# Altium footprint library Shield_v31.PcbLib: 24 footprints (part 2 of 2)
Each footprint in its own frame and in the unit in brackets; x right, y up, seen from the top. Pads: shape width x height; smd on the part's side, far side on the other; paste and mask are expansions set on the pad; w line width, h text height; cw(c..) or ccw(c..) is an arc to the next point about the centre after c.
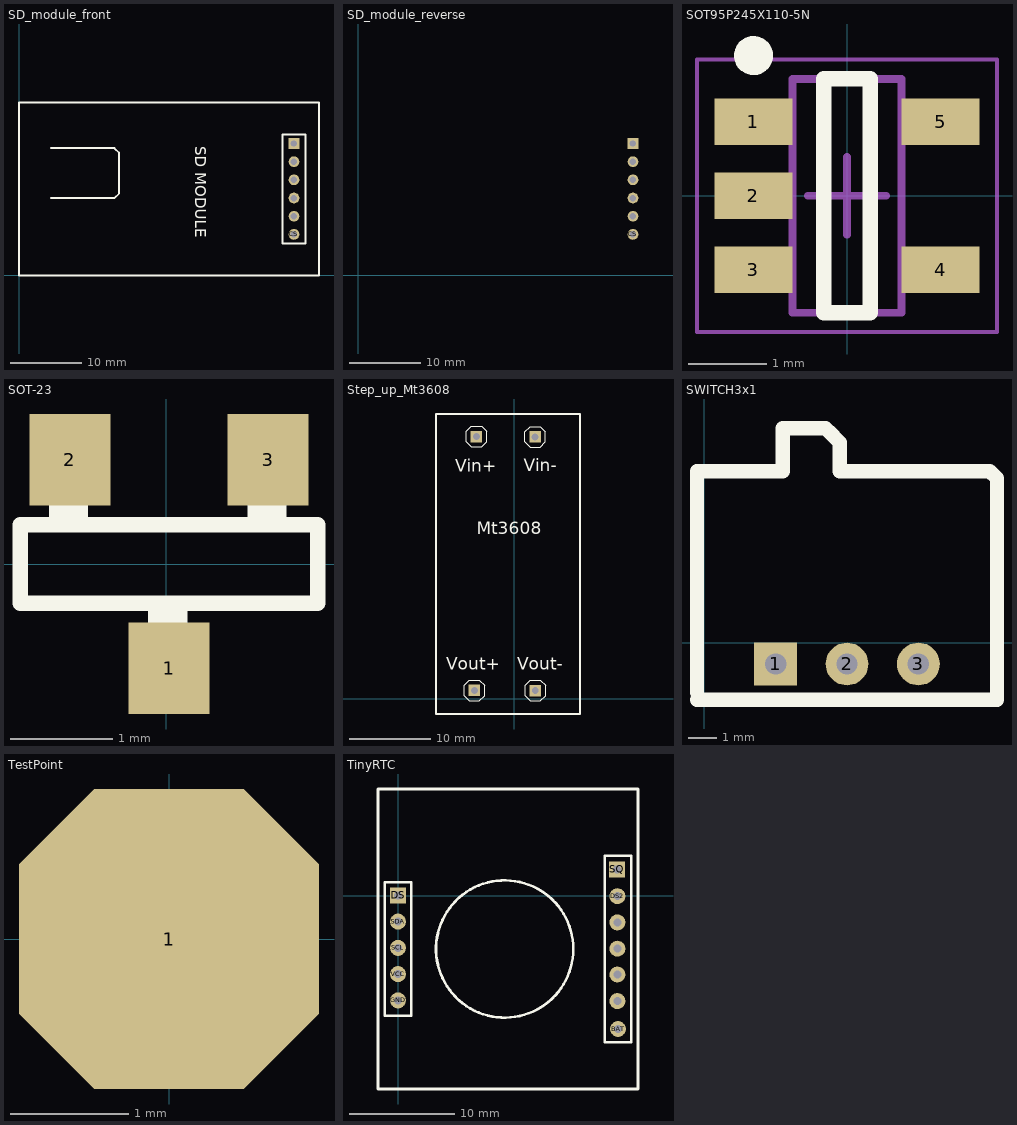
[diagram p1: the footprints below, top view; thin cyan lines are the x and y axes]

## SD_module_front [mm]
height 0.55
pads (6):
  round 1.5 hole 0.9: CLK(38.41,8.26) CS(38.41,5.72) MOSI(38.41,10.8) MOSO(38.41,13.34) VCC(38.41,15.88)
  rect 1.5x1.5 hole 0.9: GND(38.41,18.42)
Top Overlay:
  lines w0.254: 4.445,10.795 13.335,10.795 13.97,11.43 13.97,17.145 13.335,17.78 4.445,17.78 ; 0,0 0,24.13 41.91,24.13 41.91,0 0,0 ; 36.83,4.445 36.83,19.685 39.37,19.685 40.005,19.685 40.005,4.445 36.83,4.445
  text "SD MODULE" at 24.638,18.034 h1.52
3D body "PCB_sd_fr.step": height 6.79, standoff -5.91, extent 0,-0.062 42,23.938

## SD_module_reverse [mm]
height 0.55
pads (6):
  round 1.5 hole 0.9: CLK(38.41,8.26) CS(38.41,5.72) MOSI(38.41,10.8) MOSO(38.41,13.34) VCC(38.41,15.88)
  rect 1.5x1.5 hole 0.9: GND(38.41,18.42)
Bottom Overlay:
  lines w0.254: 4.445,10.795 13.335,10.795 13.97,11.43 13.97,17.145 13.335,17.78 4.445,17.78 ; 0,0 0,24.13 41.91,24.13 41.91,0 0,0 ; 36.83,4.445 36.83,19.685 39.37,19.685 40.005,19.685 40.005,4.445 36.83,4.445
  text "SD MODULE" at 24.638,18.034 h1.52
3D body "PCB_sd.step": height 5.5, standoff -7.2, extent 0,-0.062 42,23.938

## SOT95P245X110-5N [mm] "SOT23, 5-Leads, Body 2,90x2,45mm, Pitch 0,95mm, IPC Medium Density"
height 1.1
pads (5):
  rect 1x0.6 smd: 1(-1.2,0.95) 2(-1.2,0) 3(-1.2,-0.95) 4(1.2,-0.95) 5(1.2,0.95)
Top Overlay:
  circle w0.25: c-1.2,1.8 r0.125
  lines w0.2: -0.3,-1.5 -0.3,1.5 0.3,1.5 0.3,-1.5 -0.3,-1.5
Mechanical 13:
  lines w0.1: -0.7,-1.5 0.7,-1.5 0.7,1.5 -0.7,1.5 -0.7,-1.5
Mechanical 15:
  lines w0.05: -1.925,-1.75 1.925,-1.75 1.925,1.75 -1.925,1.75 -1.925,-1.75
  lines w0.1: -0.5,0 0.5,0 ; 0,-0.5 0,0.5
3D body: height 1.1, standoff 0.05, extent -0.7,-1.5 0.7,1.5

## SOT-23 [mil]
height 21.65
pads (3):
  rect 31x35 smd: 1(1,-40) 2(-37,40) 3(39,40)
Top Overlay:
  rectangle: 31,17 46,37
  rectangle: -45,17 -30,37
  rectangle: -7,-37 8,-17
  lines w6: -56,-15 58,-15 58,15 -56,15 -56,-15
3D body "User Library-SOT23-3.step": height 51.18, standoff 0, extent -57.08,-55.11 57.09,55.12

## Step_up_Mt3608 [mil]
height 21.65
pads (4):
  rect 56x56 hole 33.46: VIN+(-184.65,1277.56) VIN-(101.38,1276.58) VOUT+(-194.88,41.34) VOUT-(101.97,40.35)
Top Overlay:
  rectangle: 91.97,30.35 111.97,50.35
  rectangle: -204.88,31.34 -184.88,51.34
  rectangle: -194.65,1267.56 -174.65,1287.56
  rectangle: 91.38,1266.58 111.38,1286.58
  lines w6: -244.88,16.34 -244.88,66.34 -219.88,91.34 -169.88,91.34 -144.88,66.34 -144.88,16.34 -169.88,-8.66 -219.88,-8.66 -244.88,16.34 ; -234.65,1252.56 -209.65,1227.56 -159.65,1227.56 -134.65,1252.56 -134.65,1302.56 -159.65,1327.56 -209.65,1327.56 -234.65,1302.56 -234.65,1252.56 ; 51.38,1251.58 76.38,1226.58 126.38,1226.58 151.38,1251.58 151.38,1301.58 126.38,1326.58 76.38,1326.58 51.38,1301.58 51.38,1251.58 ; 51.97,15.35 76.97,-9.65 126.97,-9.65 151.97,15.35 151.97,65.35 126.97,90.35 76.97,90.35 51.97,65.35 51.97,15.35
  lines w10: 313.98,1387.8 -50.2,1387.8 ; -50.2,1387.8 -356.3,1387.8 -381.89,1387.8 -381.89,-73.74 -118.85,-73.74 98.18,-73.74 319.88,-73.74 319.88,1387.8 -50.2,1387.8
  text "Vin-" at 46.26,1109.25 h60
  text "Vin+" at -288.39,1105.32 h60
  text "Vout-" at 14.76,140.75 h60
  text "Vout+" at -330.71,141.73 h60
  text "Mt3608" at -184.06,801.18 h60
3D body "Step_upfinal.STEP": height 427.81, standoff -190.78, extent -375.98,-66.93 312.99,1389.76

## SWITCH3x1 [mil]
pads (3):
  rect 60x60 hole 30: 1(100,-30)
  round 60 hole 30: 2(200,-30) 3(300,-30)
Top Overlay:
  lines w20: -10,-80 410,-80 410,-70 410,230 400,240 190,240 190,280 175,295 ; -10,-70 -10,240 110,240 110,300 170,300 180,290
3D body "ESP2010.STEP": height 98.43, standoff -100.39, extent 3.15,-35.82 396.85,257.48

## TestPoint [mil]
pads (1):
  oct 100x100 smd: 1(0,0)

## TinyRTC [mil]
height 21.65
pads (12):
  round 60 hole 30: BAT(825,-500) DS2(822.83,-1.97) GND(0,-392.72) GND2(822.83,-395.08) SCL(0,-195.87) SCL2(822.83,-100.39) SDA(0,-97.44) SDA2(822.83,-198.82) VCC(0,-294.29) VCC2(822.83,-295.67)
  rect 60x60 hole 30: DS(0,1) SQ(821.85,98.42)
Top Overlay:
  circle w10: c400,-200 r257.39
  lines w10: -75,-725 -75,400 900,400 900,-725 -75,-725 ; -50,-450 50,-450 50,-50 50,50 -50,50 -50,-450 ; 775,-550 850,-550 875,-550 875,150 850,150 775,150 775,-550
3D body "TinyRTC.STEP": height 479.53, standoff -131.85, extent -79.72,-707.68 904.53,394.68